# Altium footprint library SMT.PcbLib: 325 footprints (part 6 of 21)
Each footprint in its own frame and in the unit in brackets; x right, y up, seen from the top. Pads: shape width x height; smd on the part's side, far side on the other; paste and mask are expansions set on the pad; w line width, h text height; cw(c..) or ccw(c..) is an arc to the next point about the centre after c.
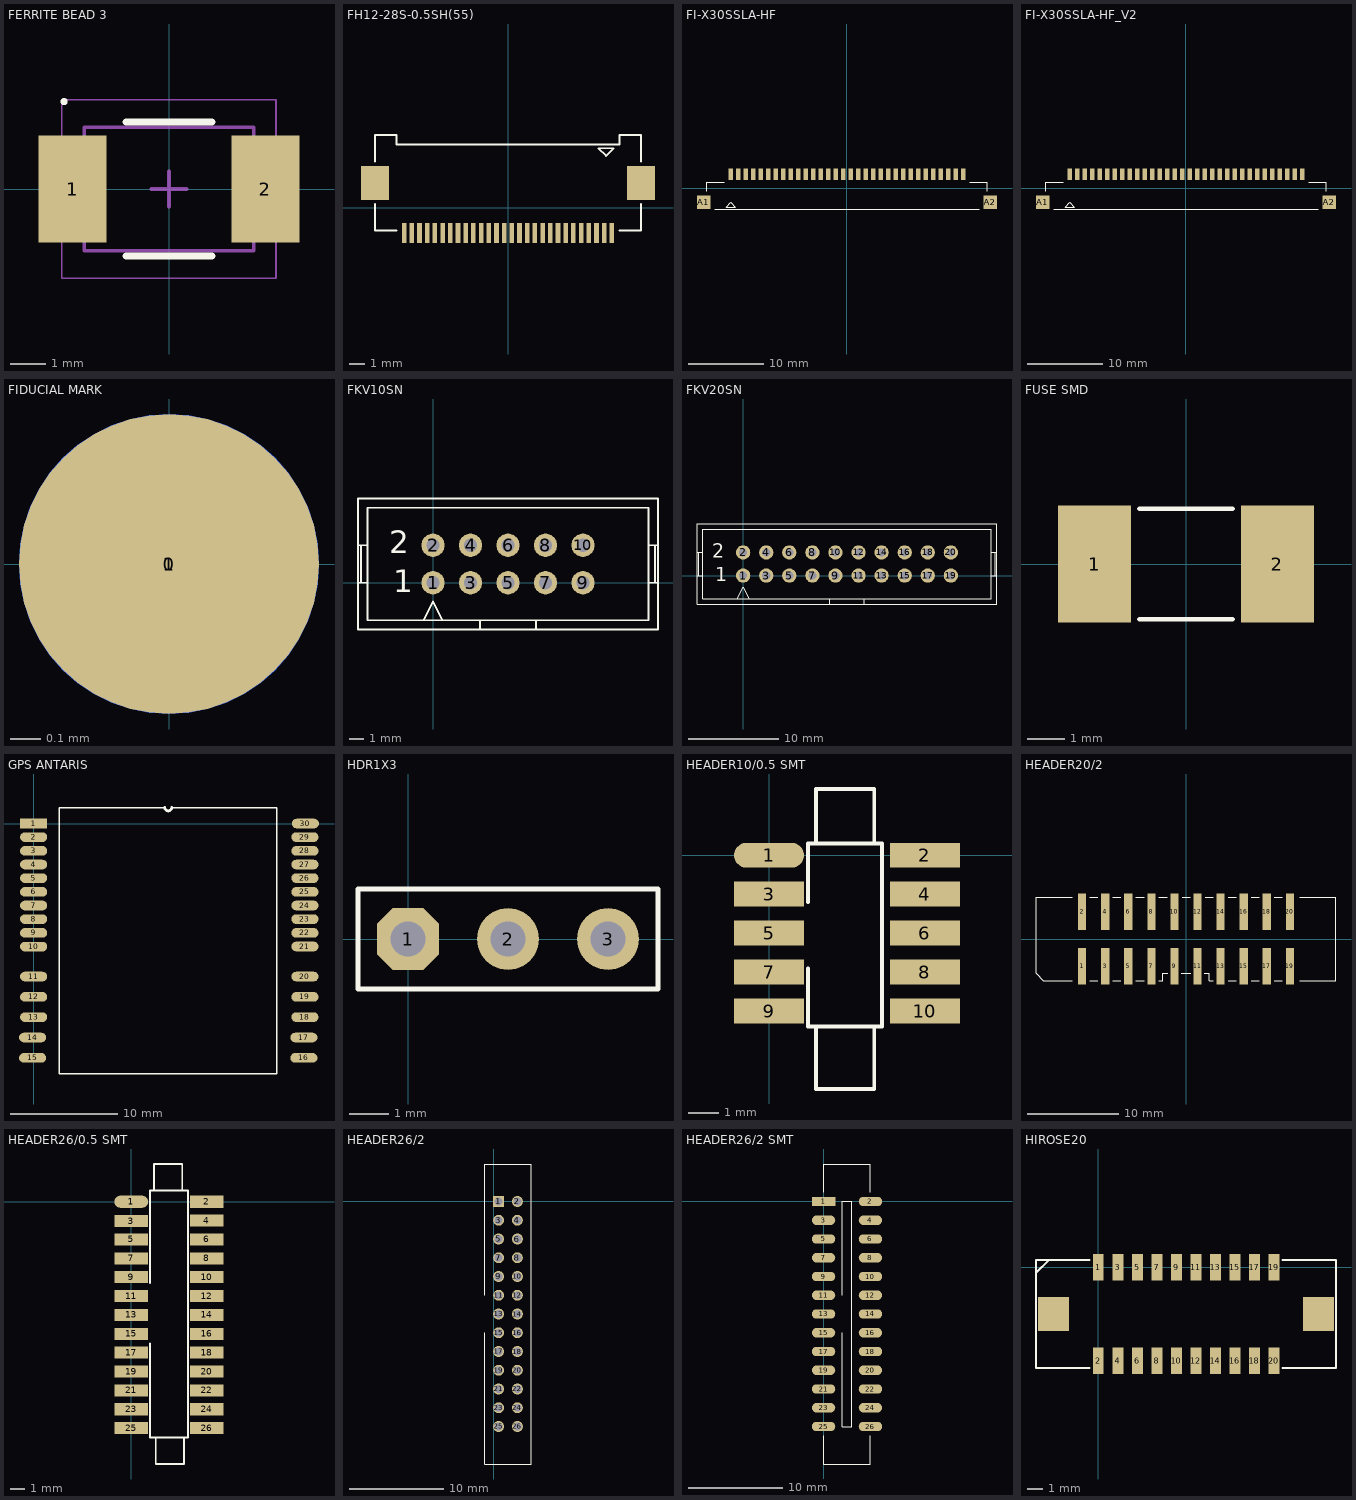
[diagram p5: the footprints below, top view; thin cyan lines are the x and y axes]

## FERRITE BEAD 3 [mm] "Wurth P/N: 74279226101"
height 2.3
pads (2):
  rect 1.9x3 smd: 1(-2.7,0) 2(2.7,0)
TopOverlay:
  circle w0.1: c-2.937,2.447 r0.05
  lines w0.2: -1.2,-1.875 1.2,-1.875 ; -1.2,1.875 1.2,1.875
Mechanical13:
  lines w0.1: -2.375,-1.725 2.375,-1.725 2.375,1.725 -2.375,1.725 -2.375,-1.725
Mechanical15:
  lines w0.05: -3,-2.5 3,-2.5 3,2.5 -3,2.5 -3,-2.5
  lines w0.1: -0.5,0 0.5,0 ; 0,-0.5 0,0.5
3D body: height 2.3, standoff 0, extent 1.875,-1.6 2.375,1.6
3D body: height 2.3, standoff 0, extent -2.375,-1.6 -1.875,1.6
3D body: height 2.3, standoff 0, extent -1.875,-1.6 1.875,1.6

## FH12-28S-0.5SH(55) [mm] "SOCKET FFC/FPC, ZIF, 0.5MM, 28WAY (1324554)"
height 2
pads (30):
  rect 0.3x1.3 smd: 1(6.75,-1.625) 2(6.25,-1.625) 3(5.75,-1.625) 4(5.25,-1.625) 5(4.75,-1.625) 6(4.25,-1.625) 7(3.75,-1.625) 8(3.25,-1.625) 9(2.75,-1.625) 10(2.25,-1.625) 11(1.75,-1.625) 12(1.25,-1.625) 13(0.75,-1.625) 14(0.25,-1.625) 15(-0.25,-1.625) 16(-0.75,-1.625) 17(-1.25,-1.625) 18(-1.75,-1.625) 19(-2.25,-1.625) 20(-2.75,-1.625) 21(-3.25,-1.625) 22(-3.75,-1.625) 23(-4.25,-1.625) 24(-4.75,-1.625) 25(-5.25,-1.625) 26(-5.75,-1.625) 27(-6.25,-1.625) 28(-6.75,-1.625)
  rect 1.8x2.2 smd: ""(-8.65,1.625) ""(8.65,1.625)
TopOverlay:
  lines w0.127: -8.65,0.25 -8.65,-1.475 -7.25,-1.475 ; -8.65,3 -8.65,4.725 -7.25,4.725 ; 7.25,-1.475 8.65,-1.475 8.65,0.25 ; 8.65,3 8.65,4.725 7.25,4.725 ; -7.25,4.725 -7.25,4.125 7.25,4.125 7.25,4.725 ; -7.25,4.725 -7.25,4.725 ; 6.375,3.375 5.875,3.875 6.875,3.875 6.375,3.375 ; 6.375,3.375 6.375,3.375 ; 7.25,4.725 7.25,4.725

## FI-X30SSLA-HF [mm] "FI-X30SSLA-HF"
height 2.3
pads (34):
  rect 0.6x1.5 smd: 1(-15.5,1.85) 2(-14.5,1.85) 3(-13.5,1.85) 4(-12.5,1.85) 5(-11.5,1.85) 6(-10.5,1.85) 7(-9.5,1.85) 8(-8.5,1.85) 9(-7.5,1.85) 10(-6.5,1.85) 11(-5.5,1.85) 12(-4.5,1.85) 13(-3.5,1.85) 14(-2.5,1.85) 15(-1.5,1.85) 16(-0.5,1.85) 17(0.5,1.85) 18(1.5,1.85) 19(2.5,1.85) 20(3.5,1.85) 21(4.5,1.85) 22(5.5,1.85) 23(6.5,1.85) 24(7.5,1.85) 25(8.5,1.85) 26(9.5,1.85) 27(10.5,1.85) 28(11.5,1.85) 29(12.5,1.85) 30(13.5,1.85) 31(14.5,1.85) 32(15.5,1.85)
  rect 1.8x1.8 smd: A1(-19.1,-1.85) A2(19.1,-1.85)
TopOverlay:
  lines w0.127: -18.675,-0.425 -18.675,0.8 -16.375,0.8 ; -17.625,-2.8 17.625,-2.8 ; 16.375,0.8 18.675,0.8 18.675,-0.425 ; -16.125,-2.5 -15.5,-1.875 -14.875,-2.5 -16.125,-2.5
3D body "K3D-FI-X30SSLA-HF-V1_JAE_Proprietary.STEP": height 2.37, standoff 0, extent -20.025,-2.8 20.025,1.95

## FI-X30SSLA-HF_V2 [mm]
pads (34):
  rect 0.6x1.5 smd: 1(-14.5,1.85) 2(-13.5,1.85) 3(-12.5,1.85) 4(-11.5,1.85) 5(-10.5,1.85) 6(-9.5,1.85) 7(-8.5,1.85) 8(-7.5,1.85) 9(-6.5,1.85) 10(-5.5,1.85) 11(-4.5,1.85) 12(-3.5,1.85) 13(-2.5,1.85) 14(-1.5,1.85) 15(-0.5,1.85) 16(0.5,1.85) 17(1.5,1.85) 18(2.5,1.85) 19(3.5,1.85) 20(4.5,1.85) 21(5.5,1.85) 22(6.5,1.85) 23(7.5,1.85) 24(8.5,1.85) 25(9.5,1.85) 26(10.5,1.85) 27(11.5,1.85) 28(12.5,1.85) 29(13.5,1.85) 30(14.5,1.85) A1(-15.5,1.85) A2(15.5,1.85)
  rect 1.8x1.8 smd: A1(-19.1,-1.85) A2(19.1,-1.85)
TopOverlay:
  lines w0.127: -18.675,-0.425 -18.675,0.8 -16.375,0.8 ; -17.625,-2.8 17.625,-2.8 ; 16.375,0.8 18.675,0.8 18.675,-0.425 ; -16.125,-2.5 -14.875,-2.5 -15.5,-1.875 -16.125,-2.5
3D body "K3D-FI-X30SSLA-HF-V1_JAE_Proprietary.STEP": height 2.37, standoff 0, extent -20.025,-2.8 20.025,1.95

## FIDUCIAL MARK [mm]
pads (2):
  round 1 smd: 0(0,0)
  round 1 smd far side: 1(0,0)

## FKV10SN [mil]
pads (10):
  round 62 hole 35: 1(0,0) 2(0,100) 3(100,0) 4(100,100) 5(200,0) 6(200,100) 7(300,0) 8(300,100) 9(400,0) 10(400,100)
TopOverlay:
  lines w5: -200,0 -175,0 ; -200,100 -175,100 ; -191.67,0 -191.67,100 ; -25,-100 0,-50 25,-100 ; 125,-125 125,-100 ; 275,-125 275,-100 ; 575,0 600,0 ; 575,100 600,100 ; 591.67,0 591.67,100 ; 125,-100 -175,-100 -175,200 575,200 575,-100 275,-100 ; 125,-100 275,-100 ; -200,-125 -200,225 600,225 600,-125 -200,-125
  text "2" at -117,79 h60
  text "1" at -106,-26 h60

## FKV20SN [mil]
pads (20):
  round 62 hole 35: 1(0,0) 2(0,100) 3(100,0) 4(100,100) 5(200,0) 6(200,100) 7(300,0) 8(300,100) 9(400,0) 10(400,100) 11(500,0) 12(500,100) 13(600,0) 14(600,100) 15(700,0) 16(700,100) 17(800,0) 18(800,100) 19(900,0) 20(900,100)
TopOverlay:
  lines w5: -200,0 -175,0 ; -200,100 -175,100 ; -191.67,0 -191.67,100 ; -25,-100 0,-50 25,-100 ; 375,-125 375,-100 ; 525,-125 525,-100 ; 1075,0 1100,0 ; 1075,100 1100,100 ; 1091.67,0 1091.67,100 ; 375,-100 -175,-100 -175,200 1075,200 1075,-100 525,-100 ; 375,-100 525,-100 ; -200,-125 -200,225 1100,225 1100,-125 -200,-125
  text "2" at -135,77 h60
  text "1" at -122,-25 h60

## FUSE SMD [mm] "LITTELFUSE - 0451001.NRL"
height 2.69
pads (2):
  rect 1.96x3.15 smd: 1(-2.45,0) 2(2.45,0)
TopOverlay:
  lines w0.127: -1.25,-1.48 0,-1.48 1.25,-1.48 ; -1.25,1.48 0,1.48 1.25,1.48
3D body: height 2.69, standoff 0, extent -1.6,-1.5 1.6,1.5
3D body: height 2.69, standoff 0, extent -3.05,-1.5 -1.6,1.5
3D body: height 2.69, standoff 0, extent 1.6,-1.5 3.05,1.5

## GPS ANTARIS [mm]
pads (30):
  rect 2.54x0.9 smd: 1(0,0)
  oval 2.54x0.9 smd: 2(0,-1.277) 3(0,-2.554) 4(0,-3.831) 5(0,-5.107) 6(0,-6.384) 7(0,-7.661) 8(0,-8.938) 9(0,-10.215) 10(0,-11.5) 11(0,-14.3) 12(0,-16.2) 13(0,-18.1) 14(-0.1,-20) 15(-0.1,-21.9) 16(25.26,-21.9) 17(25.26,-20) 18(25.36,-18.1) 19(25.36,-16.2) 20(25.36,-14.3) 21(25.36,-11.492) 22(25.36,-10.215) 23(25.36,-8.938) 24(25.36,-7.661) 25(25.36,-6.384) 26(25.36,-5.107) 27(25.36,-3.831) 28(25.36,-2.554) 29(25.36,-1.277) 30(25.4,0)
TopOverlay:
  lines w0.127: 12.262,1.5 2.4,1.5 2.4,-23.4 22.7,-23.4 22.7,1.5 12.9,1.5
  lines w0.254: 12.262,1.5 ccw(c12.581,1.5) 12.9,1.5

## HDR1X3 [mil]
pads (3):
  oct 62x62 hole 35: 1(0,0)
  round 62 hole 35: 2(100,0) 3(200,0)
TopOverlay:
  lines w5: -50,-50 -50,50 250,50 250,-50 -50,-50

## HEADER10/0.5 SMT [mil]
pads (10):
  oval 90x32 smd: 1(0,0)
  rect 90x32 smd: 2(200,0) 3(0,-50) 4(200,-50) 5(0,-100) 6(200,-100) 7(0,-150) 8(200,-150) 9(0,-200) 10(200,-200)
TopOverlay:
  lines w5: 50,-145 50,-220 145,-220 145,15 50,15 50,-60 ; 60,-220 60,-300 135,-300 135,-220 ; 60,15 60,85 135,85 135,15
  text "." at 65,5 h40

## HEADER20/2 [mm] "BOX HEADER SMT P/N: 61202020621 WURTH"
height 9.2
pads (20):
  rect 0.9x4 smd: 1(-11.43,-3) 2(-11.43,3) 3(-8.89,-3) 4(-8.89,3) 5(-6.35,-3) 6(-6.35,3) 7(-3.81,-3) 8(-3.81,3) 9(-1.27,-3) 10(-1.27,3) 11(1.27,-3) 12(1.27,3) 13(3.81,-3) 14(3.81,3) 15(6.35,-3) 16(6.35,3) 17(8.89,-3) 18(8.89,3) 19(11.43,-3) 20(11.43,3)
TopOverlay:
  lines w0.127: -12.5,-4.57 -15.69,-4.57 -16.51,-3.75 -16.51,4.57 -12.5,4.57 ; -10.6,-4.57 -9.7,-4.57 ; -10.6,4.57 -9.7,4.57 ; -8.06,-4.57 -7.16,-4.57 ; -8.06,4.57 -7.16,4.57 ; -5.52,-4.57 -4.62,-4.57 ; -5.52,4.57 -4.62,4.57 ; -2.98,-4.57 -2.54,-4.57 -2.54,-3.79 -2.5,-3.75 -2,-3.75 ; -2.98,4.57 -2.08,4.57 ; -0.5,-3.75 0.5,-3.75 ; -0.44,4.57 0.46,4.57 ; 2,-3.75 2.5,-3.75 2.54,-3.79 2.54,-4.57 2.98,-4.57 ; 2.1,4.57 3,4.57 ; 4.64,-4.57 5.54,-4.57 ; 4.64,4.57 5.54,4.57 ; 7.18,-4.57 8.08,-4.57 ; 7.18,4.57 8.08,4.57 ; 9.72,-4.57 10.62,-4.57 ; 9.72,4.57 10.62,4.57 ; 12.5,-4.57 16.51,-4.57 16.51,4.57 12.5,4.57
3D body: height 8.3, standoff 3.3, extent 0.875,0.875 1.625,1.625
3D body: height 8.3, standoff 3.3, extent 3.415,0.875 4.165,1.625
3D body: height 8.3, standoff 3.3, extent 5.955,0.875 6.705,1.625
3D body: height 8.3, standoff 3.3, extent 8.495,0.875 9.245,1.625
3D body: height 8.3, standoff 3.3, extent 11.035,0.875 11.785,1.625
3D body: height 8.3, standoff 3.3, extent -1.665,0.875 -0.915,1.625
3D body: height 8.3, standoff 3.3, extent -4.205,0.875 -3.455,1.625
3D body: height 8.3, standoff 3.3, extent -6.745,0.875 -5.995,1.625
3D body: height 8.3, standoff 3.3, extent -9.285,0.875 -8.535,1.625
3D body: height 8.3, standoff 3.3, extent -11.825,0.875 -11.075,1.625
3D body: height 8.3, standoff 3.3, extent -11.825,-1.625 -11.075,-0.875
3D body: height 8.3, standoff 3.3, extent -9.285,-1.625 -8.535,-0.875
3D body: height 8.3, standoff 3.3, extent -6.745,-1.625 -5.995,-0.875
3D body: height 8.3, standoff 3.3, extent -4.205,-1.625 -3.455,-0.875
3D body: height 8.3, standoff 3.3, extent -1.665,-1.625 -0.915,-0.875
3D body: height 8.3, standoff 3.3, extent 11.035,-1.625 11.785,-0.875
3D body: height 8.3, standoff 3.3, extent 8.495,-1.625 9.245,-0.875
3D body: height 8.3, standoff 3.3, extent 5.955,-1.625 6.705,-0.875
3D body: height 8.3, standoff 3.3, extent 3.415,-1.625 4.165,-0.875
3D body: height 8.3, standoff 3.3, extent 0.875,-1.625 1.625,-0.875
3D body: height 3.3, standoff 1.3, extent -16.51,-4.57 16.51,4.57
3D body: height 10.1, standoff 1.3, extent -16.51,-4.57 16.51,4.57

## HEADER26/0.5 SMT [mil]
pads (26):
  oval 90x32 smd: 1(0,0)
  rect 90x32 smd: 2(200,0) 3(0,-51.18) 4(200,-50) 5(0,-100) 6(200,-100) 7(0,-150) 8(200,-150) 9(0,-200) 10(200,-200) 11(0,-250) 12(200,-250) 13(0,-300) 14(200,-300) 15(0,-350) 16(200,-350) 17(0,-400) 18(200,-400) 19(0,-450) 20(200,-450) 21(0,-500) 22(200,-500) 23(0,-550) 24(200,-550) 25(0,-600) 26(200,-600)
TopOverlay:
  lines w5: 50,-375 50,-625 150,-625 150,30 50,30 50,-215 ; 60,30 60,100 135,100 135,30 ; 65,-625 65,-695 140,-695 140,-625

## HEADER26/2 [mil]
pads (26):
  rect 46x46 hole 33: 1(19.68,0)
  round 46 hole 33: 2(98.42,0) 3(19.68,-78.74) 4(98.43,-78.74) 5(19.68,-157.48) 6(98.43,-157.48) 7(19.68,-236.22) 8(98.43,-236.22) 9(19.68,-314.96) 10(98.43,-314.96) 11(19.68,-393.7) 12(98.43,-393.7) 13(19.68,-472.44) 14(98.43,-472.44) 15(19.68,-551.18) 16(98.43,-551.18) 17(19.68,-629.92) 18(98.43,-629.92) 19(19.68,-708.66) 20(98.43,-708.66) 21(19.68,-787.4) 22(98.43,-787.4) 23(19.68,-866.14) 24(98.43,-866.14) 25(19.68,-944.88) 26(98.42,-944.88)
TopOverlay:
  lines w5: -39.37,-551.18 -39.37,-1102.36 157.48,-1102.36 157.48,157.48 -39.37,157.48 -39.37,-393.7

## HEADER26/2 SMT [mm]
pads (26):
  rect 2.5x1 smd: 1(0,0)
  oval 2.5x1 smd: 2(5,0) 3(0,-2) 4(5,-2) 5(0,-4) 6(5,-4) 7(0,-6) 8(5,-6) 9(0,-8) 10(5,-8) 11(0,-10) 12(5,-10) 13(0,-12) 14(5,-12) 15(0,-14) 16(5,-14) 17(0,-16) 18(5,-16) 19(0,-18) 20(5,-18) 21(0,-20) 22(5,-20) 23(0,-22) 24(5,-22) 25(0,-24) 26(5,-24)
TopOverlay:
  lines w0.127: 0,-25 0,-28 5,-28 5,-25 ; 0,1 0,4 5,4 5,1 ; 2,-14 2,-24 3,-24 3,0 2,0 2,-10

## HIROSE20 [mm]
pads (22):
  rect 0.7x1.7 smd: 1(0,0) 2(0,-6) 3(1.25,0) 4(1.25,-6) 5(2.5,0) 6(2.5,-6) 7(3.75,0) 8(3.75,-6) 9(5,0) 10(5,-6) 11(6.25,0) 12(6.25,-6) 13(7.5,0) 14(7.5,-6) 15(8.75,0) 16(8.75,-6) 17(10,0) 18(10,-6) 19(11.25,0) 20(11.25,-6)
  rect 2x2.2 smd: ""(-2.86,-3) ""(14.1,-3)
TopOverlay:
  lines w0.127: -3.99,-0.36 -3.18,0.45 ; -0.56,-6.45 -3.99,-6.45 -3.99,0.45 -0.56,0.45 ; 11.8,-6.45 15.23,-6.45 15.23,0.45 11.8,0.45